# Altium schematic symbol library FPGA_Xilinx_Virtex5.SchLib: 41 symbols (part 5 of 17)
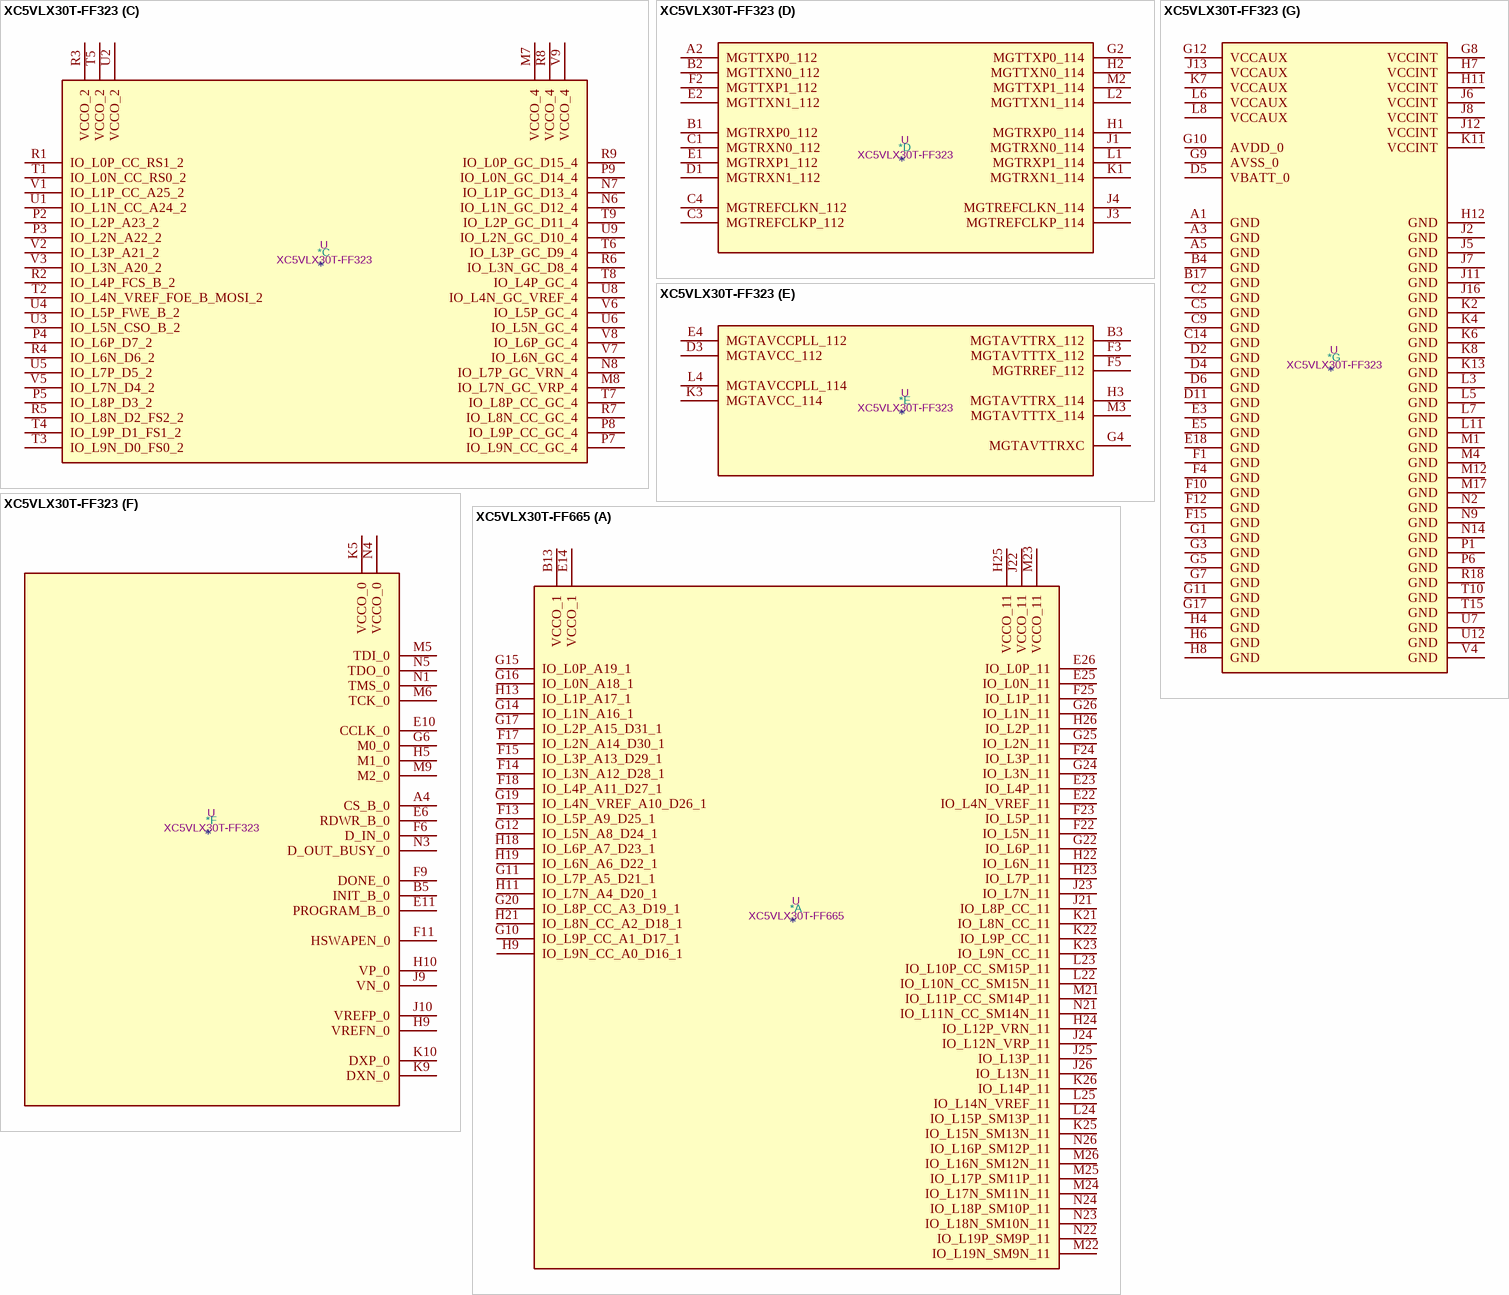
[diagram p141: symbols XC5VLX30T-FF323 to XC5VLX30T-FF665]

## XC5VLX30T-FF323
designator *  value XC5VLX30T-FF323  Reference: U
ki_keywords: FPGA; ki_description: Virtex 5 LXT 30 XC5VLX30T-FF323
part A pins: A6 IO_L0N_A18_1, A7 IO_L0P_A19_1, A8 IO_L6P_A7_D23_1, A9 IO_L6N_A6_D22_1, A10 VCCO_1, A11 IO_L3P_11, A12 IO_L3N_11, A13 IO_L5N_11, A14 IO_L7N_11, A15 VCCO_11, A16 IO_L10N_CC_SM15N_11, A17 IO_L12N_VRP_11, A18 IO_L12P_VRN_11, B6 IO_L5P_A9_D25_1, B7 VCCO_1, B8 IO_L4N_VREF_A10_D26_1, B9 IO_L4P_A11_D27_1, B10 IO_L8P_CC_A3_D19_1, B11 IO_L19P_SM9P_11, B12 VCCO_11, B13 IO_L5P_11, B14 IO_L7P_11, B15 IO_L9N_CC_11, B16 IO_L10P_CC_SM15P_11, B18 IO_L16N_SM12N_11, C6 IO_L5N_A8_D24_1, C7 IO_L3N_A12_D28_1, C8 IO_L3P_A13_D29_1, C10 IO_L8N_CC_A2_D18_1, C11 IO_L19N_SM9N_11, C12 IO_L4P_11, C13 IO_L4N_VREF_11, C15 IO_L9P_CC_11, C16 IO_L14N_VREF_11, C17 IO_L14P_11, C18 IO_L16P_SM12P_11, D7 IO_L7P_A5_D21_1, D8 IO_L1N_A16_1, D9 IO_L2N_A14_D30_1, D10 IO_L2P_A15_D31_1, D12 IO_L15P_SM13P_11, D13 IO_L0P_11, D14 IO_L0N_11, D15 IO_L1N_11, D16 VCCO_11, D17 IO_L18N_SM10N_11, D18 IO_L18P_SM10P_11, E7 IO_L7N_A4_D20_1, E8 VCCO_1, E9 IO_L1P_A17_1, E12 IO_L15N_SM13N_11, E13 VCCO_11, E14 IO_L2P_11, E15 IO_L1P_11, E16 IO_L13N_11, E17 IO_L13P_11, F7 IO_L9N_CC_A0_D16_1, F8 IO_L9P_CC_A1_D17_1, F13 IO_L8N_CC_11, F14 IO_L2N_11, F16 IO_L11P_CC_SM14P_11, F17 IO_L17N_SM11N_11, F18 IO_L17P_SM11P_11, G13 IO_L8P_CC_11, G14 IO_L6P_11, G15 IO_L6N_11, G16 IO_L11N_CC_SM14N_11
part B pins: G18 IO_L1N_SM7N_13, H13 IO_L0P_SM8P_13, H14 VCCO_13, H15 IO_L6P_SM3P_13, H16 IO_L6N_SM3N_13, H17 IO_L1P_SM7P_13, H18 IO_L3P_SM5P_13, J14 IO_L0N_SM8N_13, J15 IO_L2P_SM6P_13, J17 IO_L5P_SM4P_13, J18 IO_L3N_SM5N_13, K12 IO_L4P_13, K14 IO_L13N_13, K15 IO_L2N_SM6N_13, K16 IO_L9P_CC_SM0P_13, K17 IO_L5N_SM4N_13, K18 VCCO_13, L12 IO_L4N_VREF_13, L13 IO_L11N_CC_13, L14 IO_L13P_13, L15 VCCO_13, L16 IO_L9N_CC_SM0N_13, L17 IO_L7N_SM2N_13, L18 IO_L7P_SM2P_13, M10 IO_L4P_17, M11 IO_L8N_CC_SM1N_13, M13 IO_L15N_13, M14 IO_L11P_CC_13, M15 IO_L19N_13, M16 IO_L18N_13, M18 IO_L10N_CC_13, N10 IO_L8N_CC_17, N11 IO_L4N_VREF_17, N12 IO_L8P_CC_SM1P_13, N13 IO_L15P_13, N15 IO_L19P_13, N16 IO_L18P_13, N17 IO_L12N_VRP_13, N18 IO_L10P_CC_13, P10 IO_L8P_CC_17, P11 VCCO_17, P12 IO_L17P_17, P13 IO_L17N_17, P14 IO_L17P_13, P15 IO_L17N_13, P16 VCCO_13, P17 IO_L14N_VREF_13, P18 IO_L12P_VRN_13, R10 IO_L11P_CC_17, R11 IO_L11N_CC_17, R12 IO_L6N_17, R13 VCCO_17, R14 IO_L14P_17, R15 IO_L16P_13, R16 IO_L16N_13, R17 IO_L14P_13, T11 IO_L13P_17, T12 IO_L6P_17, T13 IO_L16N_17, T14 IO_L14N_VREF_17, T16 IO_L5N_17, T17 IO_L5P_17, T18 IO_L7P_17, U10 IO_L15N_17, U11 IO_L13N_17, U13 IO_L18P_17, U14 IO_L16P_17, U15 IO_L9N_CC_17, U16 IO_L9P_CC_17, U17 VCCO_17, U18 IO_L7N_17, V10 IO_L15P_17, V11 IO_L19N_17, V12 IO_L19P_17, V13 IO_L18N_17, V14 VCCO_17, V15 IO_L12N_VRP_17, V16 IO_L12P_VRN_17, V17 IO_L10N_CC_17, V18 IO_L10P_CC_17
part C pins: M7 VCCO_4, M8 IO_L7N_GC_VRP_4, N6 IO_L1N_GC_D12_4, N7 IO_L1P_GC_D13_4, N8 IO_L7P_GC_VRN_4, P2 IO_L2P_A23_2, P3 IO_L2N_A22_2, P4 IO_L6P_D7_2, P5 IO_L8P_D3_2, P7 IO_L9N_CC_GC_4, P8 IO_L9P_CC_GC_4, P9 IO_L0N_GC_D14_4, R1 IO_L0P_CC_RS1_2, R2 IO_L4P_FCS_B_2, R3 VCCO_2, R4 IO_L6N_D6_2, R5 IO_L8N_D2_FS2_2, R6 IO_L3N_GC_D8_4, R7 IO_L8N_CC_GC_4, R8 VCCO_4, R9 IO_L0P_GC_D15_4, T1 IO_L0N_CC_RS0_2, T2 IO_L4N_VREF_FOE_B_MOSI_2, T3 IO_L9N_D0_FS0_2, T4 IO_L9P_D1_FS1_2, T5 VCCO_2, T6 IO_L3P_GC_D9_4, T7 IO_L8P_CC_GC_4, T8 IO_L4P_GC_4, T9 IO_L2P_GC_D11_4, U1 IO_L1N_CC_A24_2, U2 VCCO_2, U3 IO_L5N_CSO_B_2, U4 IO_L5P_FWE_B_2, U5 IO_L7P_D5_2, U6 IO_L5N_GC_4, U8 IO_L4N_GC_VREF_4, U9 IO_L2N_GC_D10_4, V1 IO_L1P_CC_A25_2, V2 IO_L3P_A21_2, V3 IO_L3N_A20_2, V5 IO_L7N_D4_2, V6 IO_L5P_GC_4, V7 IO_L6N_GC_4, V8 IO_L6P_GC_4, V9 VCCO_4
part D pins: A2 MGTTXP0_112, B1 MGTRXP0_112, B2 MGTTXN0_112, C1 MGTRXN0_112, C3 MGTREFCLKP_112, C4 MGTREFCLKN_112, D1 MGTRXN1_112, E1 MGTRXP1_112, E2 MGTTXN1_112, F2 MGTTXP1_112, G2 MGTTXP0_114, H1 MGTRXP0_114, H2 MGTTXN0_114, J1 MGTRXN0_114, J3 MGTREFCLKP_114, J4 MGTREFCLKN_114, K1 MGTRXN1_114, L1 MGTRXP1_114, L2 MGTTXN1_114, M2 MGTTXP1_114
part E pins: B3 MGTAVTTRX_112, D3 MGTAVCC_112, E4 MGTAVCCPLL_112, F3 MGTAVTTTX_112, F5 MGTRREF_112, G4 MGTAVTTRXC, H3 MGTAVTTRX_114, K3 MGTAVCC_114, L4 MGTAVCCPLL_114, M3 MGTAVTTTX_114
part F pins: A4 CS_B_0, B5 INIT_B_0, E6 RDWR_B_0, E10 CCLK_0, E11 PROGRAM_B_0, F6 D_IN_0, F9 DONE_0, F11 HSWAPEN_0, G6 M0_0, H5 M1_0, H9 VREFN_0, H10 VP_0, J9 VN_0, J10 VREFP_0, K5 VCCO_0, K9 DXN_0, K10 DXP_0, M5 TDI_0, M6 TCK_0, M9 M2_0, N1 TMS_0, N3 D_OUT_BUSY_0, N4 VCCO_0, N5 TDO_0
part G pins: A1 GND, A3 GND, A5 GND, B4 GND, B17 GND, C2 GND, C5 GND, C9 GND, C14 GND, D2 GND, D4 GND, D5 VBATT_0, D6 GND, D11 GND, E3 GND, E5 GND, E18 GND, F1 GND, F4 GND, F10 GND, F12 GND, F15 GND, G1 GND, G3 GND, G5 GND, G7 GND, G8 VCCINT, G9 AVSS_0, G10 AVDD_0, G11 GND, G12 VCCAUX, G17 GND, H4 GND, H6 GND, H7 VCCINT, H8 GND, H11 VCCINT, H12 GND, J2 GND, J5 GND, J6 VCCINT, J7 GND, J8 VCCINT, J11 GND, J12 VCCINT, J13 VCCAUX, J16 GND, K2 GND, K4 GND, K6 GND, K7 VCCAUX, K8 GND, K11 VCCINT, K13 GND, L3 GND, L5 GND, L6 VCCAUX, L7 GND, L8 VCCAUX, L11 GND, M1 GND, M4 GND, M12 GND, M17 GND, N2 GND, N9 GND, N14 GND, P1 GND, P6 GND, R18 GND, T10 GND, T15 GND, U7 GND, U12 GND, V4 GND

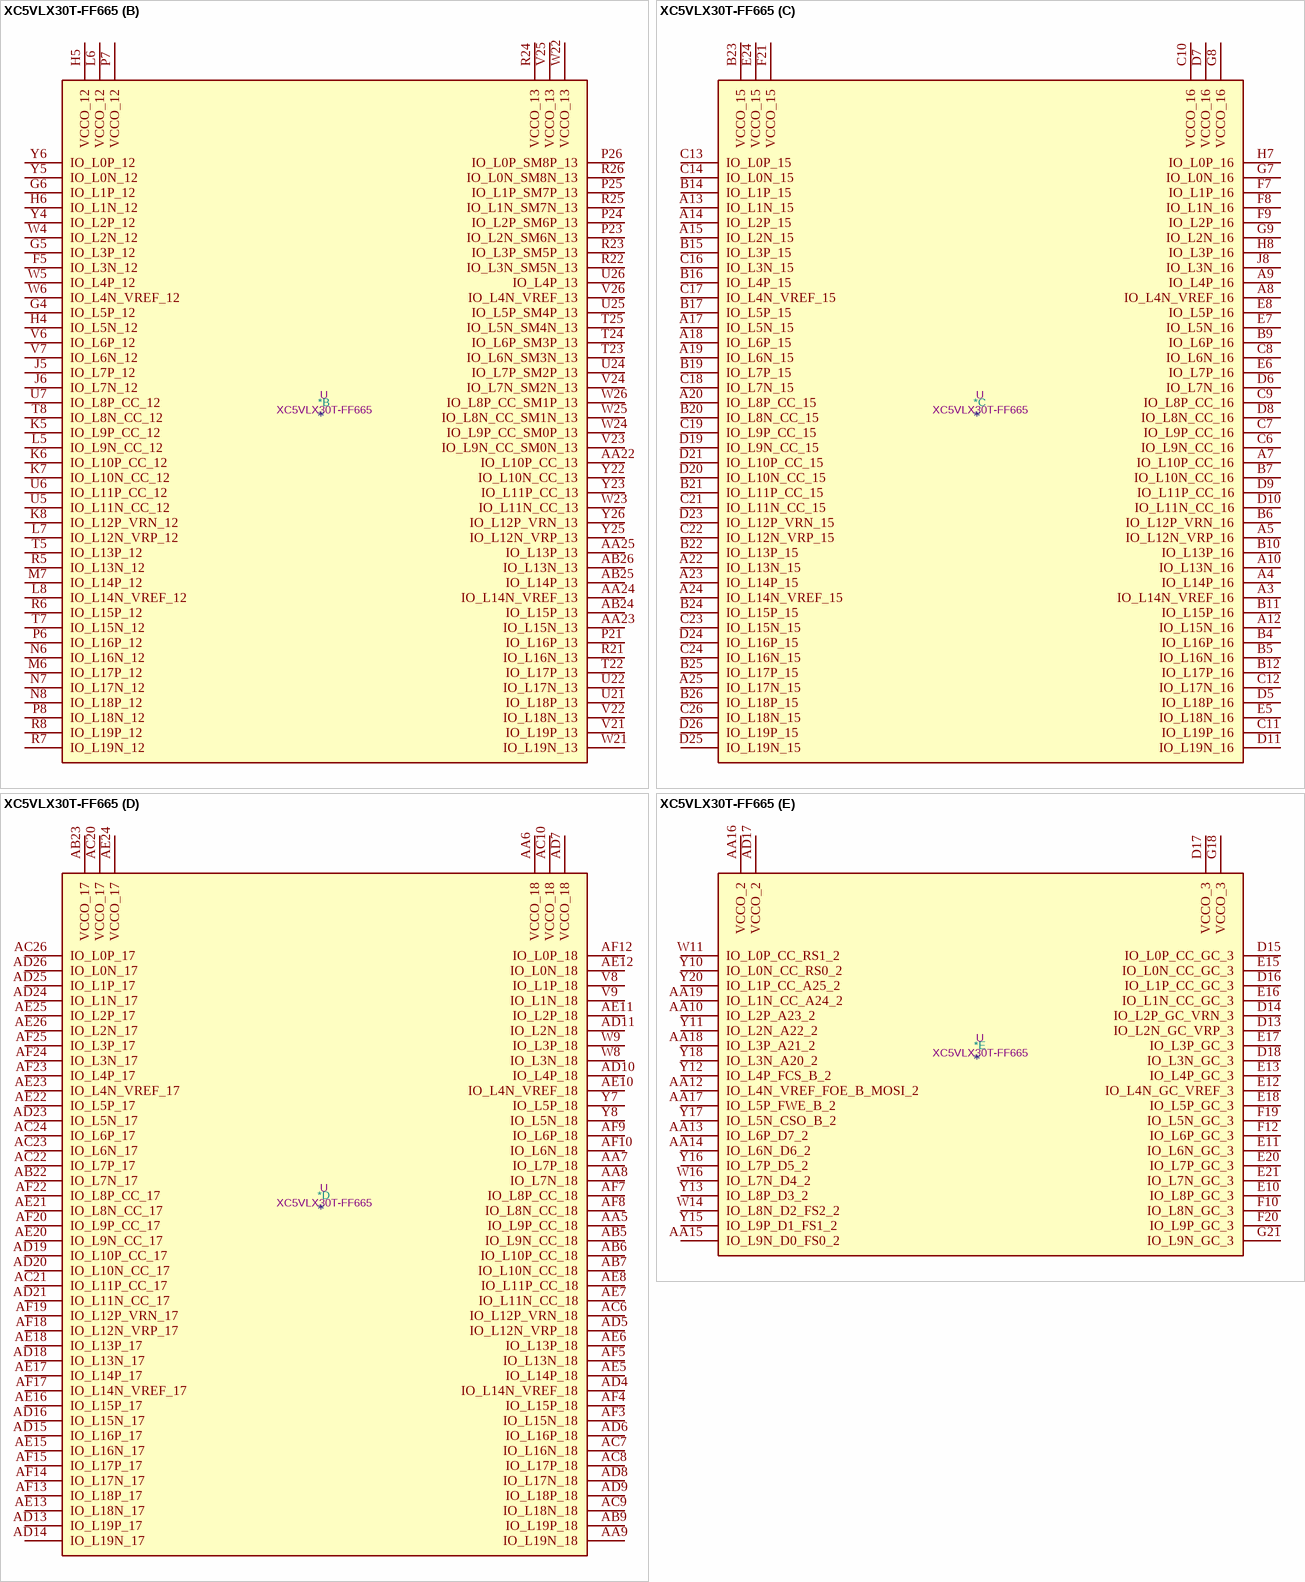
[diagram p32: symbol XC5VLX30T-FF665]

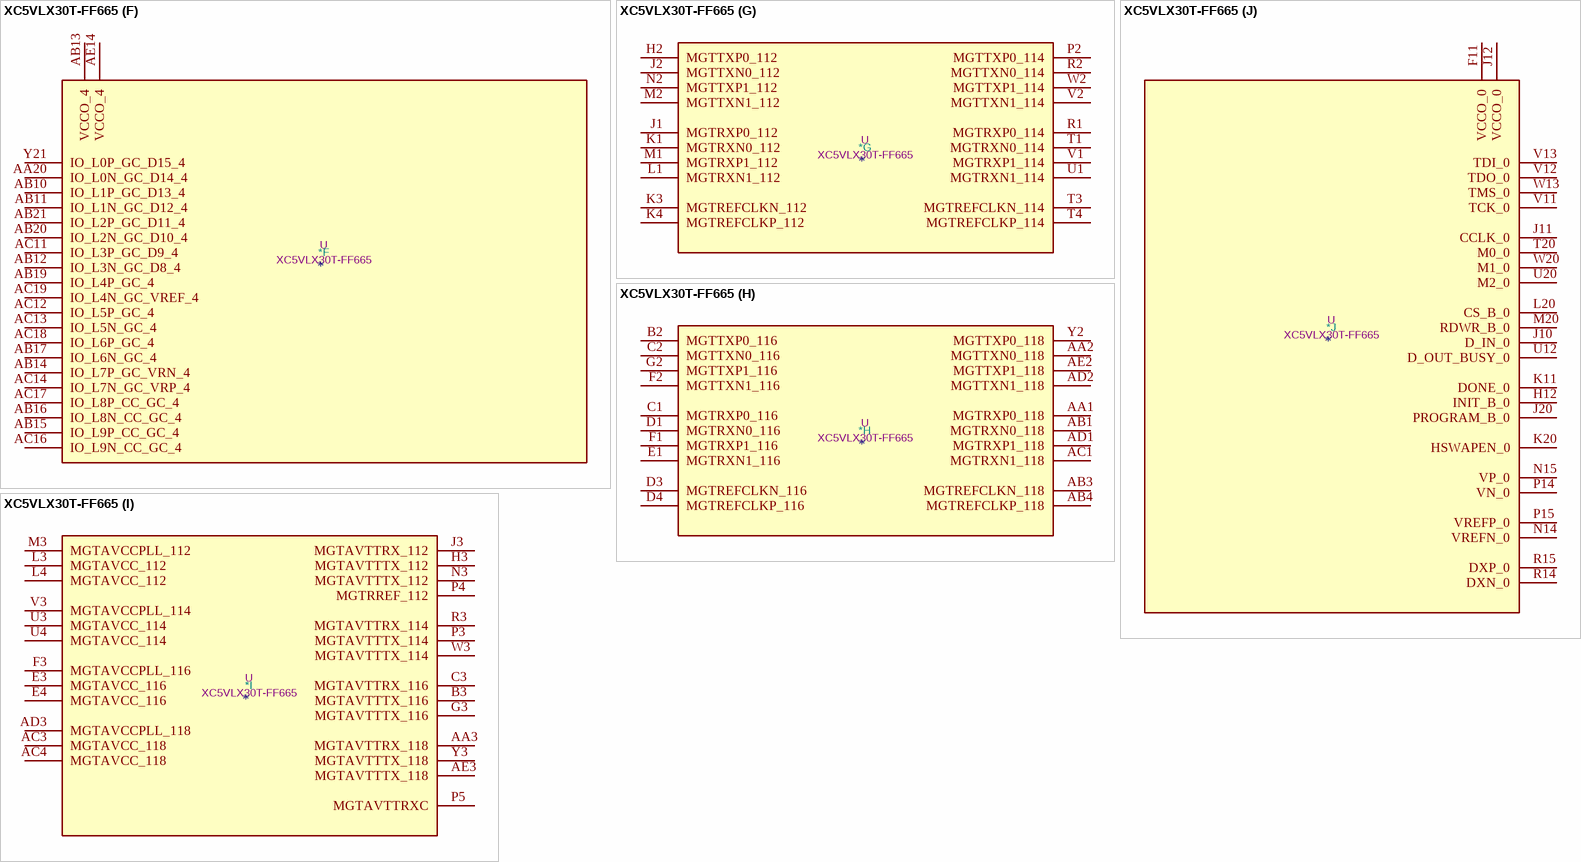
[diagram p33: symbol XC5VLX30T-FF665]

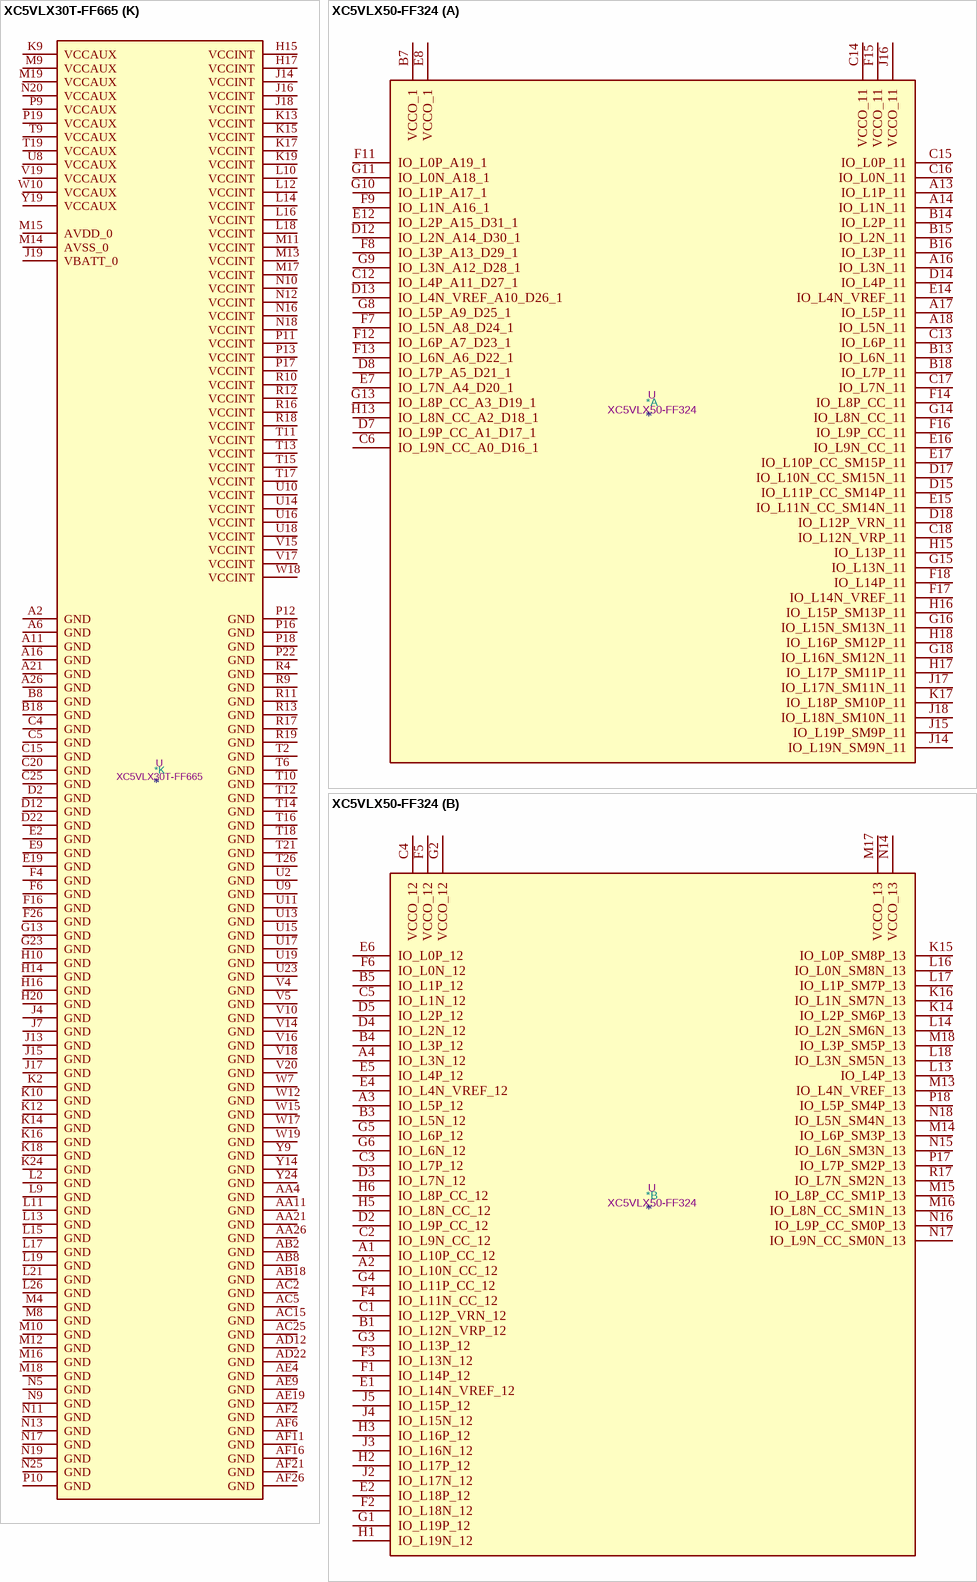
[diagram p34: symbols XC5VLX30T-FF665 to XC5VLX50-FF324]

## XC5VLX30T-FF665
designator *  value XC5VLX30T-FF665  Reference: U
ki_keywords: FPGA; ki_description: Virtex 5 LXT 30 XC5VLX30T-FF665
part A pins: B13 VCCO_1, E14 VCCO_1, E22 IO_L4N_VREF_11, E23 IO_L4P_11, E25 IO_L0N_11, E26 IO_L0P_11, F13 IO_L5P_A9_D25_1, F14 IO_L3N_A12_D28_1, F15 IO_L3P_A13_D29_1, F17 IO_L2N_A14_D30_1, F18 IO_L4P_A11_D27_1, F22 IO_L5N_11, F23 IO_L5P_11, F24 IO_L3P_11, F25 IO_L1P_11, G10 IO_L9P_CC_A1_D17_1, G11 IO_L7P_A5_D21_1, G12 IO_L5N_A8_D24_1, G14 IO_L1N_A16_1, G15 IO_L0P_A19_1, G16 IO_L0N_A18_1, G17 IO_L2P_A15_D31_1, G19 IO_L4N_VREF_A10_D26_1, G20 IO_L8P_CC_A3_D19_1, G22 IO_L6P_11, G24 IO_L3N_11, G25 IO_L2N_11, G26 IO_L1N_11, H9 IO_L9N_CC_A0_D16_1, H11 IO_L7N_A4_D20_1, H13 IO_L1P_A17_1, H18 IO_L6P_A7_D23_1, H19 IO_L6N_A6_D22_1, H21 IO_L8N_CC_A2_D18_1, H22 IO_L6N_11, H23 IO_L7P_11, H24 IO_L12P_VRN_11, H25 VCCO_11, H26 IO_L2P_11, J21 IO_L8P_CC_11, J22 VCCO_11, J23 IO_L7N_11, J24 IO_L12N_VRP_11, J25 IO_L13P_11, J26 IO_L13N_11, K21 IO_L8N_CC_11, K22 IO_L9P_CC_11, K23 IO_L9N_CC_11, K25 IO_L15N_SM13N_11, K26 IO_L14P_11, L22 IO_L10N_CC_SM15N_11, L23 IO_L10P_CC_SM15P_11, L24 IO_L15P_SM13P_11, L25 IO_L14N_VREF_11, M21 IO_L11P_CC_SM14P_11, M22 IO_L19N_SM9N_11, M23 VCCO_11, M24 IO_L17N_SM11N_11, M25 IO_L17P_SM11P_11, M26 IO_L16N_SM12N_11, N21 IO_L11N_CC_SM14N_11, N22 IO_L19P_SM9P_11, N23 IO_L18N_SM10N_11, N24 IO_L18P_SM10P_11, N26 IO_L16P_SM12P_11
part B pins: AA22 IO_L10P_CC_13, AA23 IO_L15N_13, AA24 IO_L14N_VREF_13, AA25 IO_L13P_13, AB24 IO_L15P_13, AB25 IO_L14P_13, AB26 IO_L13N_13, F5 IO_L3N_12, G4 IO_L5P_12, G5 IO_L3P_12, G6 IO_L1P_12, H4 IO_L5N_12, H5 VCCO_12, H6 IO_L1N_12, J5 IO_L7P_12, J6 IO_L7N_12, K5 IO_L9P_CC_12, K6 IO_L10P_CC_12, K7 IO_L10N_CC_12, K8 IO_L12P_VRN_12, L5 IO_L9N_CC_12, L6 VCCO_12, L7 IO_L12N_VRP_12, L8 IO_L14N_VREF_12, M6 IO_L17P_12, M7 IO_L14P_12, N6 IO_L16N_12, N7 IO_L17N_12, N8 IO_L18P_12, P6 IO_L16P_12, P7 VCCO_12, P8 IO_L18N_12, P21 IO_L16P_13, P23 IO_L2N_SM6N_13, P24 IO_L2P_SM6P_13, P25 IO_L1P_SM7P_13, P26 IO_L0P_SM8P_13, R5 IO_L13N_12, R6 IO_L15P_12, R7 IO_L19N_12, R8 IO_L19P_12, R21 IO_L16N_13, R22 IO_L3N_SM5N_13, R23 IO_L3P_SM5P_13, R24 VCCO_13, R25 IO_L1N_SM7N_13, R26 IO_L0N_SM8N_13, T5 IO_L13P_12, T7 IO_L15N_12, T8 IO_L8N_CC_12, T22 IO_L17P_13, T23 IO_L6N_SM3N_13, T24 IO_L6P_SM3P_13, T25 IO_L5N_SM4N_13, U5 IO_L11N_CC_12, U6 IO_L11P_CC_12, U7 IO_L8P_CC_12, U21 IO_L18P_13, U22 IO_L17N_13, U24 IO_L7P_SM2P_13, U25 IO_L5P_SM4P_13, U26 IO_L4P_13, V6 IO_L6P_12, V7 IO_L6N_12, V21 IO_L19P_13, V22 IO_L18N_13, V23 IO_L9N_CC_SM0N_13, V24 IO_L7N_SM2N_13, V25 VCCO_13, V26 IO_L4N_VREF_13, W4 IO_L2N_12, W5 IO_L4P_12, W6 IO_L4N_VREF_12, W21 IO_L19N_13, W22 VCCO_13, W23 IO_L11N_CC_13, W24 IO_L9P_CC_SM0P_13, W25 IO_L8N_CC_SM1N_13, W26 IO_L8P_CC_SM1P_13, Y4 IO_L2P_12, Y5 IO_L0N_12, Y6 IO_L0P_12, Y22 IO_L10N_CC_13, Y23 IO_L11P_CC_13, Y25 IO_L12N_VRP_13, Y26 IO_L12P_VRN_13
part C pins: A3 IO_L14N_VREF_16, A4 IO_L14P_16, A5 IO_L12N_VRP_16, A7 IO_L10P_CC_16, A8 IO_L4N_VREF_16, A9 IO_L4P_16, A10 IO_L13N_16, A12 IO_L15N_16, A13 IO_L1N_15, A14 IO_L2P_15, A15 IO_L2N_15, A17 IO_L5N_15, A18 IO_L6P_15, A19 IO_L6N_15, A20 IO_L8P_CC_15, A22 IO_L13N_15, A23 IO_L14P_15, A24 IO_L14N_VREF_15, A25 IO_L17N_15, B4 IO_L16P_16, B5 IO_L16N_16, B6 IO_L12P_VRN_16, B7 IO_L10N_CC_16, B9 IO_L6P_16, B10 IO_L13P_16, B11 IO_L15P_16, B12 IO_L17P_16, B14 IO_L1P_15, B15 IO_L3P_15, B16 IO_L4P_15, B17 IO_L5P_15, B19 IO_L7P_15, B20 IO_L8N_CC_15, B21 IO_L11P_CC_15, B22 IO_L13P_15, B23 VCCO_15, B24 IO_L15P_15, B25 IO_L17P_15, B26 IO_L18P_15, C6 IO_L9N_CC_16, C7 IO_L9P_CC_16, C8 IO_L6N_16, C9 IO_L8P_CC_16, C10 VCCO_16, C11 IO_L19P_16, C12 IO_L17N_16, C13 IO_L0P_15, C14 IO_L0N_15, C16 IO_L3N_15, C17 IO_L4N_VREF_15, C18 IO_L7N_15, C19 IO_L9P_CC_15, C21 IO_L11N_CC_15, C22 IO_L12N_VRP_15, C23 IO_L15N_15, C24 IO_L16N_15, C26 IO_L18N_15, D5 IO_L18P_16, D6 IO_L7N_16, D7 VCCO_16, D8 IO_L8N_CC_16, D9 IO_L11P_CC_16, D10 IO_L11N_CC_16, D11 IO_L19N_16, D19 IO_L9N_CC_15, D20 IO_L10N_CC_15, D21 IO_L10P_CC_15, D23 IO_L12P_VRN_15, D24 IO_L16P_15, D25 IO_L19N_15, D26 IO_L19P_15, E5 IO_L18N_16, E6 IO_L7P_16, E7 IO_L5N_16, E8 IO_L5P_16, E24 VCCO_15, F7 IO_L1P_16, F8 IO_L1N_16, F9 IO_L2P_16, F21 VCCO_15, G7 IO_L0N_16, G8 VCCO_16, G9 IO_L2N_16, H7 IO_L0P_16, H8 IO_L3P_16, J8 IO_L3N_16
part D pins: AA5 IO_L9P_CC_18, AA6 VCCO_18, AA7 IO_L7P_18, AA8 IO_L7N_18, AA9 IO_L19N_18, AB5 IO_L9N_CC_18, AB6 IO_L10P_CC_18, AB7 IO_L10N_CC_18, AB9 IO_L19P_18, AB22 IO_L7N_17, AB23 VCCO_17, AC6 IO_L12P_VRN_18, AC7 IO_L16N_18, AC8 IO_L17P_18, AC9 IO_L18N_18, AC10 VCCO_18, AC20 VCCO_17, AC21 IO_L11P_CC_17, AC22 IO_L7P_17, AC23 IO_L6N_17, AC24 IO_L6P_17, AC26 IO_L0P_17, AD4 IO_L14N_VREF_18, AD5 IO_L12N_VRP_18, AD6 IO_L16P_18, AD7 VCCO_18, AD8 IO_L17N_18, AD9 IO_L18P_18, AD10 IO_L4P_18, AD11 IO_L2N_18, AD13 IO_L19P_17, AD14 IO_L19N_17, AD15 IO_L16P_17, AD16 IO_L15N_17, AD18 IO_L13N_17, AD19 IO_L10P_CC_17, AD20 IO_L10N_CC_17, AD21 IO_L11N_CC_17, AD23 IO_L5N_17, AD24 IO_L1N_17, AD25 IO_L1P_17, AD26 IO_L0N_17, AE5 IO_L14P_18, AE6 IO_L13P_18, AE7 IO_L11N_CC_18, AE8 IO_L11P_CC_18, AE10 IO_L4N_VREF_18, AE11 IO_L2P_18, AE12 IO_L0N_18, AE13 IO_L18N_17, AE15 IO_L16N_17, AE16 IO_L15P_17, AE17 IO_L14P_17, AE18 IO_L13P_17, AE20 IO_L9N_CC_17, AE21 IO_L8N_CC_17, AE22 IO_L5P_17, AE23 IO_L4N_VREF_17, AE24 VCCO_17, AE25 IO_L2P_17, AE26 IO_L2N_17, AF3 IO_L15N_18, AF4 IO_L15P_18, AF5 IO_L13N_18, AF7 IO_L8P_CC_18, AF8 IO_L8N_CC_18, AF9 IO_L6P_18, AF10 IO_L6N_18, AF12 IO_L0P_18, AF13 IO_L18P_17, AF14 IO_L17N_17, AF15 IO_L17P_17, AF17 IO_L14N_VREF_17, AF18 IO_L12N_VRP_17, AF19 IO_L12P_VRN_17, AF20 IO_L9P_CC_17, AF22 IO_L8P_CC_17, AF23 IO_L4P_17, AF24 IO_L3N_17, AF25 IO_L3P_17, V8 IO_L1P_18, V9 IO_L1N_18, W8 IO_L3N_18, W9 IO_L3P_18, Y7 IO_L5P_18, Y8 IO_L5N_18
part E pins: AA10 IO_L2P_A23_2, AA12 IO_L4N_VREF_FOE_B_MOSI_2, AA13 IO_L6P_D7_2, AA14 IO_L6N_D6_2, AA15 IO_L9N_D0_FS0_2, AA16 VCCO_2, AA17 IO_L5P_FWE_B_2, AA18 IO_L3P_A21_2, AA19 IO_L1N_CC_A24_2, AD17 VCCO_2, D13 IO_L2N_GC_VRP_3, D14 IO_L2P_GC_VRN_3, D15 IO_L0P_CC_GC_3, D16 IO_L1P_CC_GC_3, D17 VCCO_3, D18 IO_L3N_GC_3, E10 IO_L8P_GC_3, E11 IO_L6N_GC_3, E12 IO_L4N_GC_VREF_3, E13 IO_L4P_GC_3, E15 IO_L0N_CC_GC_3, E16 IO_L1N_CC_GC_3, E17 IO_L3P_GC_3, E18 IO_L5P_GC_3, E20 IO_L7P_GC_3, E21 IO_L7N_GC_3, F10 IO_L8N_GC_3, F12 IO_L6P_GC_3, F19 IO_L5N_GC_3, F20 IO_L9P_GC_3, G18 VCCO_3, G21 IO_L9N_GC_3, W11 IO_L0P_CC_RS1_2, W14 IO_L8N_D2_FS2_2, W16 IO_L7N_D4_2, Y10 IO_L0N_CC_RS0_2, Y11 IO_L2N_A22_2, Y12 IO_L4P_FCS_B_2, Y13 IO_L8P_D3_2, Y15 IO_L9P_D1_FS1_2, Y16 IO_L7P_D5_2, Y17 IO_L5N_CSO_B_2, Y18 IO_L3N_A20_2, Y20 IO_L1P_CC_A25_2
part F pins: AA20 IO_L0N_GC_D14_4, AB10 IO_L1P_GC_D13_4, AB11 IO_L1N_GC_D12_4, AB12 IO_L3N_GC_D8_4, AB13 VCCO_4, AB14 IO_L7P_GC_VRN_4, AB15 IO_L9P_CC_GC_4, AB16 IO_L8N_CC_GC_4, AB17 IO_L6N_GC_4, AB19 IO_L4P_GC_4, AB20 IO_L2N_GC_D10_4, AB21 IO_L2P_GC_D11_4, AC11 IO_L3P_GC_D9_4, AC12 IO_L5P_GC_4, AC13 IO_L5N_GC_4, AC14 IO_L7N_GC_VRP_4, AC16 IO_L9N_CC_GC_4, AC17 IO_L8P_CC_GC_4, AC18 IO_L6P_GC_4, AC19 IO_L4N_GC_VREF_4, AE14 VCCO_4, Y21 IO_L0P_GC_D15_4
part G pins: H2 MGTTXP0_112, J1 MGTRXP0_112, J2 MGTTXN0_112, K1 MGTRXN0_112, K3 MGTREFCLKN_112, K4 MGTREFCLKP_112, L1 MGTRXN1_112, M1 MGTRXP1_112, M2 MGTTXN1_112, N2 MGTTXP1_112, P2 MGTTXP0_114, R1 MGTRXP0_114, R2 MGTTXN0_114, T1 MGTRXN0_114, T3 MGTREFCLKN_114, T4 MGTREFCLKP_114, U1 MGTRXN1_114, V1 MGTRXP1_114, V2 MGTTXN1_114, W2 MGTTXP1_114
part H pins: AA1 MGTRXP0_118, AA2 MGTTXN0_118, AB1 MGTRXN0_118, AB3 MGTREFCLKN_118, AB4 MGTREFCLKP_118, AC1 MGTRXN1_118, AD1 MGTRXP1_118, AD2 MGTTXN1_118, AE2 MGTTXP1_118, B2 MGTTXP0_116, C1 MGTRXP0_116, C2 MGTTXN0_116, D1 MGTRXN0_116, D3 MGTREFCLKN_116, D4 MGTREFCLKP_116, E1 MGTRXN1_116, F1 MGTRXP1_116, F2 MGTTXN1_116, G2 MGTTXP1_116, Y2 MGTTXP0_118
part I pins: AA3 MGTAVTTRX_118, AC3 MGTAVCC_118, AC4 MGTAVCC_118, AD3 MGTAVCCPLL_118, AE3 MGTAVTTTX_118, B3 MGTAVTTTX_116, C3 MGTAVTTRX_116, E3 MGTAVCC_116, E4 MGTAVCC_116, F3 MGTAVCCPLL_116, G3 MGTAVTTTX_116, H3 MGTAVTTTX_112, J3 MGTAVTTRX_112, L3 MGTAVCC_112, L4 MGTAVCC_112, M3 MGTAVCCPLL_112, N3 MGTAVTTTX_112, P3 MGTAVTTTX_114, P4 MGTRREF_112, P5 MGTAVTTRXC, R3 MGTAVTTRX_114, U3 MGTAVCC_114, U4 MGTAVCC_114, V3 MGTAVCCPLL_114, W3 MGTAVTTTX_114, Y3 MGTAVTTTX_118
part J pins: F11 VCCO_0, H12 INIT_B_0, J10 D_IN_0, J11 CCLK_0, J12 VCCO_0, J20 PROGRAM_B_0, K11 DONE_0, K20 HSWAPEN_0, L20 CS_B_0, M20 RDWR_B_0, N14 VREFN_0, N15 VP_0, P14 VN_0, P15 VREFP_0, R14 DXN_0, R15 DXP_0, T20 M0_0, U12 D_OUT_BUSY_0, U20 M2_0, V11 TCK_0, V12 TDO_0, V13 TDI_0, W13 TMS_0, W20 M1_0
part K pins: A2 GND, A6 GND, A11 GND, A16 GND, A21 GND, A26 GND, AA4 GND, AA11 GND, AA21 GND, AA26 GND, AB2 GND, AB8 GND, AB18 GND, AC2 GND, AC5 GND, AC15 GND, AC25 GND, AD12 GND, AD22 GND, AE4 GND, AE9 GND, AE19 GND, AF2 GND, AF6 GND, AF11 GND, AF16 GND, AF21 GND, AF26 GND, B8 GND, B18 GND, C4 GND, C5 GND, C15 GND, C20 GND, C25 GND, D2 GND, D12 GND, D22 GND, E2 GND, E9 GND, E19 GND, F4 GND, F6 GND, F16 GND, F26 GND, G13 GND, G23 GND, H10 GND, H14 GND, H15 VCCINT, H16 GND, H17 VCCINT, H20 GND, J4 GND, J7 GND, J13 GND, J14 VCCINT, J15 GND, J16 VCCINT, J17 GND, J18 VCCINT, J19 VBATT_0, K2 GND, K9 VCCAUX, K10 GND, K12 GND, K13 VCCINT, K14 GND, K15 VCCINT, K16 GND, K17 VCCINT, K18 GND, K19 VCCINT, K24 GND, L2 GND, L9 GND, L10 VCCINT, L11 GND, L12 VCCINT, L13 GND, L14 VCCINT, L15 GND, L16 VCCINT, L17 GND, L18 VCCINT, L19 GND, L21 GND, L26 GND, M4 GND, M8 GND, M9 VCCAUX, M10 GND, M11 VCCINT, M12 GND, M13 VCCINT, M14 AVSS_0, M15 AVDD_0, M16 GND, M17 VCCINT, M18 GND, M19 VCCAUX, N5 GND, N9 GND, N10 VCCINT, N11 GND, N12 VCCINT, N13 GND, N16 VCCINT, N17 GND, N18 VCCINT, N19 GND, N20 VCCAUX, N25 GND, P9 VCCAUX, P10 GND, P11 VCCINT, P12 GND, P13 VCCINT, P16 GND, P17 VCCINT, P18 GND, P19 VCCAUX, P22 GND, R4 GND, R9 GND, R10 VCCINT, R11 GND, R12 VCCINT, R13 GND, R16 VCCINT, R17 GND, R18 VCCINT, R19 GND, T2 GND, T6 GND, T9 VCCAUX, T10 GND, T11 VCCINT, T12 GND, T13 VCCINT, T14 GND, T15 VCCINT, T16 GND, T17 VCCINT, T18 GND, T19 VCCAUX, T21 GND, T26 GND, U2 GND, U8 VCCAUX, U9 GND, U10 VCCINT, U11 GND, U13 GND, U14 VCCINT, U15 GND, U16 VCCINT, U17 GND, U18 VCCINT, U19 GND, U23 GND, V4 GND, V5 GND, V10 GND, V14 GND, V15 VCCINT, V16 GND, V17 VCCINT, V18 GND, V19 VCCAUX, V20 GND, W7 GND, W10 VCCAUX, W12 GND, W15 GND, W17 GND, W18 VCCINT, W19 GND, Y9 GND, Y14 GND, Y19 VCCAUX, Y24 GND
